# Altium footprint library JL_PCB.PCBLIB: 1112 footprints (part 4 of 71)
Each footprint in its own frame and in the unit in brackets; x right, y up, seen from the top. Pads: shape width x height; smd on the part's side, far side on the other; paste and mask are expansions set on the pad; w line width, h text height; cw(c..) or ccw(c..) is an arc to the next point about the centre after c.
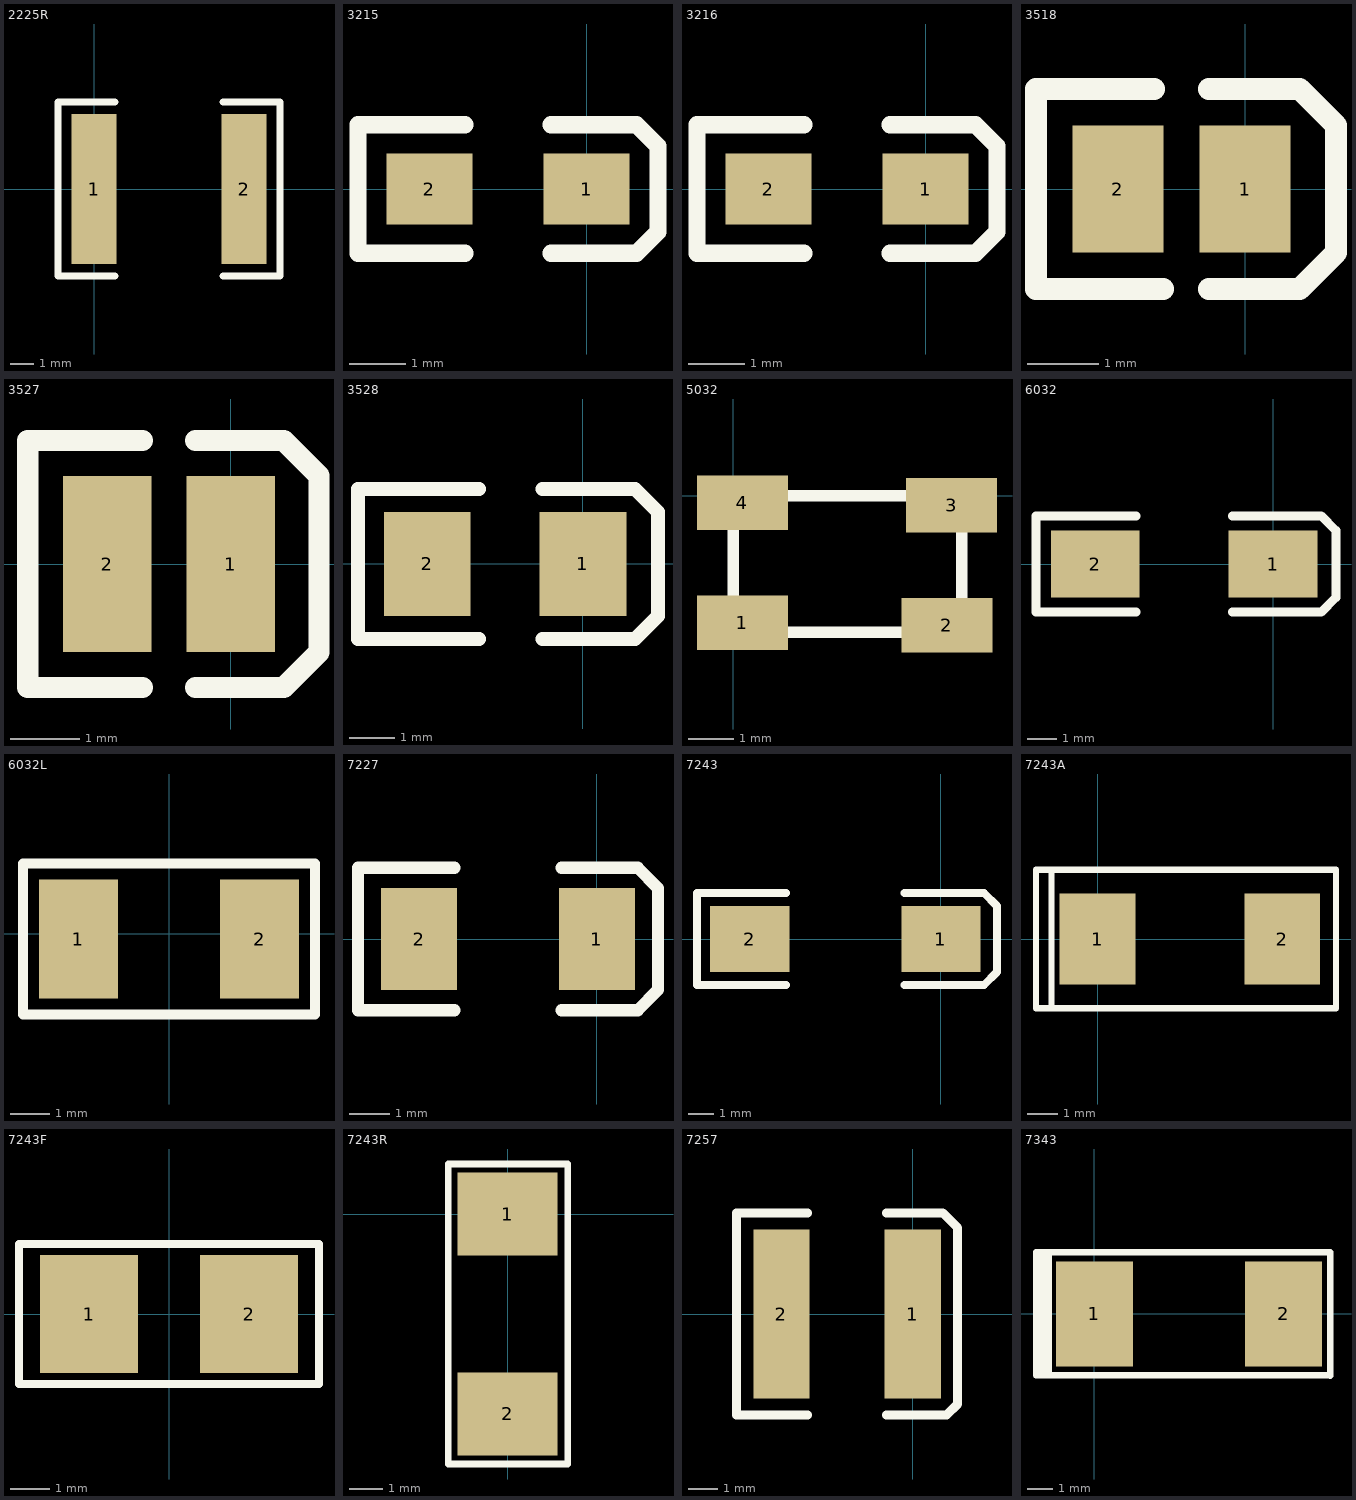
[diagram p3: the footprints below, top view; thin cyan lines are the x and y axes]

## 2225R [mil]
pads (2):
  rect 75x250 smd: 1(0,0) 2(250,0)
TopOverlay:
  lines w12: 35,-145 -60,-145 -60,145 35,145 ; 215,-145 310,-145 310,145 215,145
3D body "2225R.STEP": height 59.06, standoff 0, extent 13.8,-126 238.21,124

## 3215 [mil]
pads (2):
  rect 60x50 smd: 1(0,0) 2(-110,0)
TopOverlay:
  lines w12: -85,-45 -160,-45 -160,45 -85,45 ; -25,-45 35,-45 50,-30 50,30 35,45 -25,45
3D body "3216.step": height 73, standoff 0.6, extent -151.1,-35.5 37.7,35.5

## 3216 [mil]
pads (2):
  rect 60x50 smd: 1(0,0) 2(-110,0)
TopOverlay:
  lines w12: -85,-45 -160,-45 -160,45 -85,45 ; -25,-45 35,-45 50,-30 50,30 35,45 -25,45
3D body "3216.step": height 73, standoff 0.6, extent -151.1,-35.5 37.7,35.5

## 3518 [mil]
pads (2):
  rect 50x70 smd: 1(0,0) 2(-70,0)
TopOverlay:
  lines w12: -50,55 -115,55 -115,-55 -45,-55 ; -20,-55 30,-55 50,-35 50,35 30,55 -20,55

## 3527 [mil]
pads (2):
  rect 50x100 smd: 1(0,0) 2(-70,0)
TopOverlay:
  lines w12: -50,-70 -115,-70 -115,70 -50,70 ; -20,-70 30,-70 50,-50 50,50 30,70 -20,70

## 3528 [mil]
pads (2):
  rect 75x90 smd: 1(0,0) 2(-135,0)
TopOverlay:
  lines w12: -90,-65 -195,-65 -195,65 -90,65 ; -35,-65 45,-65 65,-45 65,45 45,65 -35,65
3D body "3528.step": height 85, standoff 0.6, extent -165.4,-59 31.4,59

## 5032 [mil]
pads (4):
  rect 78.74x47.24 smd: 1(8,-110) 2(185,-112) 3(189,-8) 4(8,-6)
TopOverlay:
  lines w10: 0,-118.11 0,0 196.85,0 ; 1,-118 197.85,-118 ; 198,-117.11 198,1

## 6032 [mil]
pads (2):
  rect 120x90 smd: 1(0,0) 2(-240,0)
TopOverlay:
  lines w12: -185,-65 -320,-65 -320,65 -185,65 ; -55,-65 65,-65 85,-45 85,45 65,65 -55,65
3D body "6032.step": height 112, standoff 0.6, extent -267.55,-69.3 31.55,69

## 6032L [mil]
pads (2):
  rect 78.74x118.11 smd: 1(-90,-5) 2(90,-5)
TopOverlay:
  lines w10: -145,-80 -145,70 145,70 145,-80 -145,-80

## 7227 [mil]
pads (2):
  rect 75x100 smd: 1(0,0) 2(-175,0)
TopOverlay:
  lines w12: -140,-70 -235,-70 -235,70 -140,70 ; -35,-70 40,-70 60,-50 60,50 40,70 -35,70

## 7243 [mil]
pads (2):
  rect 120x100 smd: 1(0,0) 2(-290,0)
TopOverlay:
  lines w12: -235,-70 -370,-70 -370,70 -235,70 ; -55,-70 65,-70 85,-50 85,50 65,70 -55,70
3D body "7343.step": height 124, standoff 0.6, extent -323.1,-90.51 31.1,91

## 7243A [mm]
pads (2):
  rect 2.5x3 smd: 1(0,0) 2(6.096,0)
TopOverlay:
  lines w0.2: -1.778,-2.286 7.874,-2.286 7.874,2.286 -1.778,2.286 -2.032,2.286 -2.032,-2.286 -1.524,-2.286 -1.524,2.286

## 7243F [mm]
pads (2):
  rect 2.5x3 smd: 1(-2.032,0) 2(2.032,0)
TopOverlay:
  lines w0.2: -3.81,-1.778 -3.81,1.778 3.81,1.778 3.81,-1.778 -3.81,-1.778

## 7243R [mm]
pads (2):
  rect 3x2.5 smd: 1(0,0) 2(0,-5.994)
TopOverlay:
  lines w0.2: 1.778,1.499 -1.778,1.499 -1.778,-7.493 1.803,-7.493 1.803,1.499

## 7257 [mil]
pads (2):
  rect 75x225 smd: 1(0,0) 2(-175,0)
TopOverlay:
  lines w12: -140,-135 -235,-135 -235,135 -140,135 ; -35,-135 45,-135 60,-120 60,115 40,135 -35,135

## 7343 [mm]
pads (2):
  rect 3x4.1 smd: 1(0,0) 2(7.396,0)
TopOverlay:
  lines w0.254: -2.032,-2.405 -2.032,2.405 ; -1.778,-2.405 -1.778,2.405 ; 9.216,-2.413 9.216,2.397 ; 9.216,-2.405 -2.286,-2.405 -2.286,2.405 9.216,2.405